# Altium footprint library IC.PcbLib: 220 footprints (part 11 of 14)
Each footprint in its own frame and in the unit in brackets; x right, y up, seen from the top. Pads: shape width x height; smd on the part's side, far side on the other; paste and mask are expansions set on the pad; w line width, h text height; cw(c..) or ccw(c..) is an arc to the next point about the centre after c.
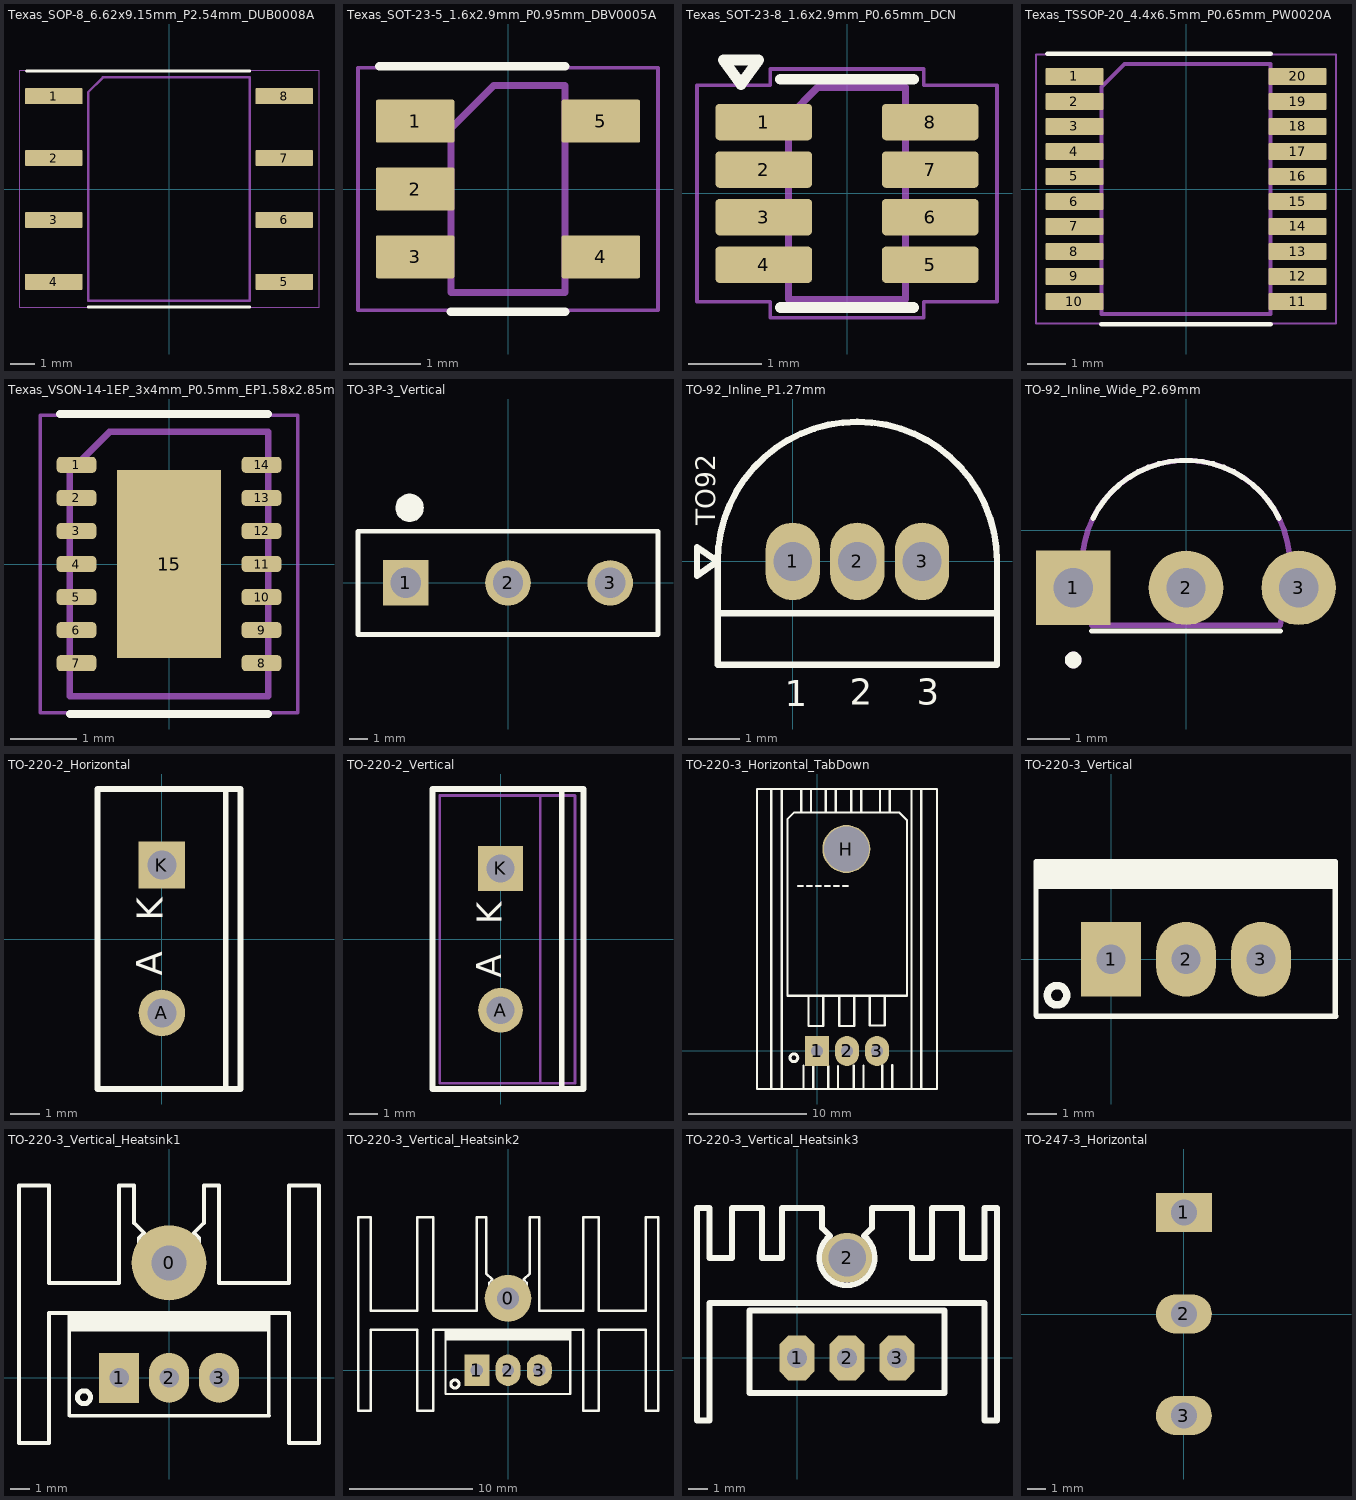
[diagram p10: the footprints below, top view; thin cyan lines are the x and y axes]

## Texas_SOP-8_6.62x9.15mm_P2.54mm_DUB0008A [mm] "ISO1050DUBR, 1 Mbps isolated CAN transceiver, 2.5 kVrms — Thu phát CAN cách ly 2,5 kVrms, 1 Mbps [Thu phat CAN cach ly 2,5 kVrms, 1 Mbps]"
height 4.85
pads (8):
  rrect8% 2.35x0.65 smd: 1(-4.725,3.81) 2(-4.725,1.27) 3(-4.725,-1.27) 4(-4.725,-3.81) 5(4.725,-3.81) 6(4.725,-1.27) 7(4.725,1.27) 8(4.725,3.81)
Top Overlay:
  lines w0.12: -5.85,4.845 3.31,4.845 ; -3.31,-4.845 3.31,-4.845
  text ".Designator" at -3.31,5.05 h1
Mechanical 2:
  lines w0.1: -3.31,-4.575 3.31,-4.575 3.31,4.575 -2.71,4.575 -3.31,3.975 -3.31,-4.575
Mechanical 4:
  lines w0.05: -6.15,-4.85 6.15,-4.85 6.15,4.85 -6.15,4.85 -6.15,-4.85
3D body "Texas_SOP-8_6.62x9.15mm_P2.54mm_DUB0008A.step": height 0, standoff 0, extent -5.9,-4.135 5.9,4.135

## Texas_SOT-23-5_1.6x2.9mm_P0.95mm_DBV0005A [mm] "TLV75533PDBVR, 3.3 V, 500 mA LDO regulator with output discharge — Ổn áp LDO 3,3 V, 500 mA, có xả ngõ ra [On ap LDO 3,3 V, 500 mA, co xa ngo ra]"
height 1.45
pads (5):
  rrect8% 1.1x0.6 smd: 1(-1.3,0.95) 2(-1.3,0) 3(-1.3,-0.95) 4(1.3,-0.95) 5(1.3,0.95)
Top Overlay:
  lines w0.12: -1.8,1.72 0.8,1.72 ; -0.8,-1.72 0.8,-1.72
  text ".Designator" at -0.8,1.9 h1
Mechanical 2:
  lines w0.1: -0.8,-1.45 0.8,-1.45 0.8,1.45 -0.2,1.45 -0.8,0.85 -0.8,-1.45
Mechanical 4:
  lines w0.05: -2.1,-1.7 2.1,-1.7 2.1,1.7 -2.1,1.7 -2.1,-1.7
3D body "Texas_SOT-23-5_1.6x2.9mm_P0.95mm_DBV0005A.step": height 0, standoff 0, extent -1.85,-1.25 1.85,1.25

## Texas_SOT-23-8_1.6x2.9mm_P0.65mm_DCN [mm] "INA219AIDCNR, I2C current, voltage and power monitor — IC đo dòng, điện áp và công suất qua I2C [IC do dong, dien ap va cong suat qua I2C]"
height 1.2
pads (8):
  rrect25% 1.325x0.5 smd: 1(-1.138,0.975) 2(-1.138,0.325) 3(-1.138,-0.325) 4(-1.138,-0.975) 5(1.138,-0.975) 6(1.138,-0.325) 7(1.138,0.325) 8(1.138,0.975)
Top Overlay:
  lines w0.15: -0.91,-1.56 0.91,-1.56 ; -0.91,1.56 0.91,1.56 ; -1.69,1.82 -1.45,1.49 -1.21,1.82 -1.69,1.82
Mechanical 2:
  lines w0.1: -0.8,-1.45 0.8,-1.45 0.8,1.45 -0.4,1.45 -0.8,1.05 -0.8,-1.45
Mechanical 4:
  lines w0.05: -2.05,-1.48 -2.05,1.48 -1.05,1.48 -1.05,1.7 1.05,1.7 1.05,1.48 2.05,1.48 2.05,-1.48 1.05,-1.48 1.05,-1.7 -1.05,-1.7 -1.05,-1.48 -2.05,-1.48
3D body "Texas_SOT-23-8_1.6x2.9mm_P0.65mm_DCN.step": height 0, standoff 0, extent -1.8,-1.225 1.8,1.225

## Texas_TSSOP-20_4.4x6.5mm_P0.65mm_PW0020A [mm] "BQ7692003PWR, 3–5 cell Li-ion/LiFePO4 battery AFE, I2C with CRC — IC đo và bảo vệ pin Li-ion/LiFePO4 3–5 cell, I2C có CRC [IC do va bao ve pin Li-ion/LiFePO4 3–5 cell, I2C co CRC]"
height 1.2
pads (20):
  rrect11% 1.5x0.45 smd: 1(-2.9,2.925) 2(-2.9,2.275) 3(-2.9,1.625) 4(-2.9,0.975) 5(-2.9,0.325) 6(-2.9,-0.325) 7(-2.9,-0.975) 8(-2.9,-1.625) 9(-2.9,-2.275) 10(-2.9,-2.925) 11(2.9,-2.925) 12(2.9,-2.275) 13(2.9,-1.625) 14(2.9,-0.975) 15(2.9,-0.325) 16(2.9,0.325) 17(2.9,0.975) 18(2.9,1.625) 19(2.9,2.275) 20(2.9,2.925)
Top Overlay:
  lines w0.12: -3.6,3.52 2.2,3.52 ; -2.2,-3.52 2.2,-3.52
  text ".Designator" at -2.2,3.7 h1
Mechanical 2:
  lines w0.1: -2.2,-3.25 2.2,-3.25 2.2,3.25 -1.6,3.25 -2.2,2.65 -2.2,-3.25
Mechanical 4:
  lines w0.05: -3.9,-3.5 3.9,-3.5 3.9,3.5 -3.9,3.5 -3.9,-3.5
3D body "Texas_TSSOP-20_4.4x6.5mm_P0.65mm_PW0020A.step": height 0, standoff 0, extent -3.65,-3.15 3.65,3.15

## Texas_VSON-14-1EP_3x4mm_P0.5mm_EP1.58x2.85mm_DSJ [mm] "TPS63020DSJR, Adjustable synchronous buck-boost converter, 1.8–5.5 V input — Nguồn xung tăng giảm áp đồng bộ chỉnh được, đầu vào 1,8–5,5 V [Nguon xung tang giam ap dong bo chinh duoc, dau vao 1,8–5,5 V]"
height 1
pads (15):
  rrect50% 0.6x0.24 smd mask+0.07: 1(-1.4,1.5) 2(-1.4,1) 3(-1.4,0.5) 4(-1.4,0) 5(-1.4,-0.5) 6(-1.4,-1) 7(-1.4,-1.5) 8(1.4,-1.5) 9(1.4,-1) 10(1.4,-0.5) 11(1.4,0) 12(1.4,0.5) 13(1.4,1) 14(1.4,1.5)
  rect 1.58x2.85 smd paste-2.85 mask+0.03: 15(0,0)
Top Overlay:
  lines w0.12: -1.65,2.27 1.5,2.27 ; -1.5,-2.27 1.5,-2.27
  text ".Designator" at -1.5,2.45 h1
Top Paste:
  region: -0.68,-1.225 -0.667,-1.275 -0.63,-1.312 -0.58,-1.325 0.58,-1.325 0.63,-1.312 0.667,-1.275 0.68,-1.225 0.68,-0.225 0.667,-0.175 0.63,-0.138 0.58,-0.125 -0.58,-0.125 -0.63,-0.138 -0.667,-0.175 -0.68,-0.225
  region: -0.68,0.225 -0.667,0.175 -0.63,0.138 -0.58,0.125 0.58,0.125 0.63,0.138 0.667,0.175 0.68,0.225 0.68,1.225 0.667,1.275 0.63,1.312 0.58,1.325 -0.58,1.325 -0.63,1.312 -0.667,1.275 -0.68,1.225
Mechanical 2:
  lines w0.1: -1.5,-2 1.5,-2 1.5,2 -0.9,2 -1.5,1.4 -1.5,-2
Mechanical 4:
  lines w0.05: -1.95,-2.25 1.95,-2.25 1.95,2.25 -1.95,2.25 -1.95,-2.25
3D body "Texas_VSON-14-1EP_3x4mm_P0.5mm_EP1.58x2.85mm_DSJ.step": height 0, standoff 0, extent -1.7,-1.62 1.7,1.62

## TO-3P-3_Vertical [mm] "TO-3P / TO-3PN 3-pin + mounting hole vertical, pitch 5.45mm"
height 23.8
pads (4):
  rect 2.43x2.43 hole 1.62: 1(-5.45,0)
  round 2.43 hole 1.62: 2(0,0) 3(5.45,0)
  round 1.524 on Top Overlay: ""(-5.25,4)
Top Overlay:
  lines w0.254: -8,-2.75 8,-2.75 8,2.75 -8,2.75 -8,-2.75
3D body "FGA60N65SMD.stp": height 23.4, standoff -37.4, extent -7.8,-2.5 7.8,2.5

## TO-92_Inline_P1.27mm [mil] "TO-92 inline, 3 pins, pitch 1.27mm"
height 342.52
pads (3):
  oval 42x60 hole 30 mask+3: 1(0,0) 2(50,0) 3(100,0)
Top Overlay:
  lines w5: -58,-40 158,-40 ; -58,0 cw(c50,0) 158,0 158,-80 -58,-80 -58,0 ; -58,0 -74,-11 -74,11 -58,0
  text "1" at -6,-112 h20
  text "2" at 44,-111 h20
  text "3" at 96,-111 h20
  text "TO92" at -60,28 h15
3D body "TO-92-2.STEP": height 418.5, standoff -140.55, extent -44.37,-63.73 144.39,93.75

## TO-92_Inline_Wide_P2.69mm [mm] "TO-92 wide inline, 3 pins, pitch 2.69mm (DS18B20)"
pads (3):
  rect 1.778x1.778 hole 0.94: 1(-2.69,-1.37)
  round 1.778 hole 0.94: 2(0,-1.37) 3(2.69,-1.37)
Top Overlay:
  circle w0.2: c-2.69,-3.093 r0.1
  lines w0.127: -2.246,-2.4 2.246,-2.4 ; -2.219,0.285 cw(c0,-0.797) 2.219,0.285
Mechanical 13:
  circle w0.2: c-2.69,-3.093 r0.1
  lines w0.127: -2.475,-0.803 cw(c0,-0.803) 2.475,-0.803 2.246,-2.268 -2.246,-2.268 -2.475,-0.803
3D body "ALSRobot-TO-92W.STEP": height 7.24, standoff -4.06, extent -2.765,-3.084 2.765,1.016

## TO-220-2_Horizontal [mm] "TO-220AC 2-pin bent/horizontal, pitch 5.08mm"
pads (2):
  round 1.6 hole 1: A(0,-2.54)
  rect 1.6x1.6 hole 1: K(0,2.54)
Top Overlay:
  lines w0.2: 2.195,-5.15 2.195,5.15 ; -2.205,-5.15 2.695,-5.15 2.695,5.15 -2.205,5.15 -2.205,-5.15
  text "K" at 0.33,0.635 h1.52
  text "A" at 0.305,-1.27 h1.52
3D body "User Library-TO220 L.step": height 7.2, standoff -0.3, extent -0.052,-4.9 19.652,5.1

## TO-220-2_Vertical [mm] "TO-220AC 2-pin vertical, pitch 5.08mm"
height 19.05
pads (2):
  round 1.6 hole 1: A(0,-2.54)
  rect 1.6x1.6 hole 1: K(0,2.54)
Top Overlay:
  lines w0.2: 2.184,-5.258 2.195,5.334 ; -2.438,-5.359 2.972,-5.359 2.972,5.385 -2.438,5.385 -2.438,-5.359
  text "A" at 0.33,-1.372 h1.52
  text "K" at 0.356,0.533 h1.52
Mechanical 8:
  lines w0.1: 1.42,-5.15 1.42,5.15 ; -2.18,-5.15 2.67,-5.15 2.67,5.15 -2.18,5.15 -2.18,-5.15
3D body: height 14.33, standoff 12.8, extent 1.42,-4.975 2.67,4.975
3D body: height 19.05, standoff 18.18, extent 1.42,-4.975 2.67,4.975
3D body: height 14.37, standoff 14.33, extent 1.42,-4.975 2.67,-0.376
3D body: height 18.18, standoff 18.14, extent 1.42,-4.975 2.67,-0.376
3D body: height 14.48, standoff 14.36, extent 1.42,-4.975 2.67,-0.737
3D body: height 18.14, standoff 18.03, extent 1.42,-4.975 2.67,-0.737
3D body: height 2.79, standoff 0, extent -0.25,1.875 0.25,3.205
3D body: height 14.37, standoff 14.33, extent 1.42,0.376 2.67,4.975
3D body: height 18.18, standoff 18.14, extent 1.42,0.376 2.67,4.975
3D body: height 14.48, standoff 14.36, extent 1.42,0.737 2.67,4.975
3D body: height 18.14, standoff 18.03, extent 1.42,0.737 2.67,4.975
3D body: height 14.65, standoff 14.47, extent 1.42,1.069 2.67,4.975
3D body: height 18.03, standoff 17.85, extent 1.42,1.069 2.67,4.975
3D body: height 14.89, standoff 14.65, extent 1.42,1.361 2.67,4.975
3D body: height 17.86, standoff 17.61, extent 1.42,1.361 2.67,4.975
3D body: height 15.19, standoff 14.89, extent 1.42,1.601 2.67,4.975
3D body: height 17.62, standoff 17.32, extent 1.42,1.601 2.67,4.975
3D body: height 15.52, standoff 15.18, extent 1.42,1.778 2.67,4.975
3D body: height 17.32, standoff 16.99, extent 1.42,1.778 2.67,4.975
3D body: height 15.88, standoff 15.51, extent 1.42,1.888 2.67,4.975
3D body: height 16.99, standoff 16.63, extent 1.42,1.888 2.67,4.975
3D body: height 16.25, standoff 15.87, extent 1.42,1.925 2.67,4.975
3D body: height 16.63, standoff 16.25, extent 1.42,1.925 2.67,4.975
3D body: height 2.79, standoff 0, extent -0.25,-3.205 0.25,-1.875
3D body: height 14.65, standoff 14.47, extent 1.42,-4.975 2.67,-1.069
3D body: height 18.03, standoff 17.85, extent 1.42,-4.975 2.67,-1.069
3D body: height 14.89, standoff 14.65, extent 1.42,-4.975 2.67,-1.361
3D body: height 17.86, standoff 17.61, extent 1.42,-4.975 2.67,-1.361
3D body: height 15.19, standoff 14.89, extent 1.42,-4.975 2.67,-1.601
3D body: height 17.62, standoff 17.32, extent 1.42,-4.975 2.67,-1.601
3D body: height 15.52, standoff 15.18, extent 1.42,-4.975 2.67,-1.778
3D body: height 17.32, standoff 16.99, extent 1.42,-4.975 2.67,-1.778
3D body: height 15.88, standoff 15.51, extent 1.42,-4.975 2.67,-1.888
3D body: height 16.99, standoff 16.63, extent 1.42,-4.975 2.67,-1.888
3D body: height 16.25, standoff 15.87, extent 1.42,-4.975 2.67,-1.925
3D body: height 16.63, standoff 16.25, extent 1.42,-4.975 2.67,-1.925
3D body: height 0, standoff -1.6, extent -0.25,2.155 0.25,2.925
3D body: height 0, standoff -1.6, extent -0.25,-2.925 0.25,-2.155
3D body: height 12.8, standoff 2.79, extent -2.18,-5.15 2.67,5.15

## TO-220-3_Horizontal_TabDown [mil] "TO-220 3-pin horizontal with mounting hole, pitch 2.54mm"
height 200
pads (4):
  rect 80x100 hole 39: 1(0,0)
  oval 80x100 hole 39: 2(100,0) 3(200,0)
  round 160 hole 150: H(98,673)
Top Overlay:
  circle w10: c-77.03,-23 r12.97
  lines w7: -99,549 -99,772 -77,794 275,794 300,769 300,730 ; -99,552 -99,184 300,184 300,553 ; -29,178 -29,83 21,83 21,180 20,181 ; 74,178 74,83 124,83 124,180 123,181 ; 176,180 176,85 226,85 226,182 225,183 ; 300,552 300,733
  lines w8: -152,-127 -152,873 ; -117,-127 -117,873 ; -53,796 -53.01,869.97 ; -45,-124 -45.01,-50.03 ; -20,796 -20.01,869.97 ; -12,-124 -12.01,-50.03 ; 29,795 28.99,868.97 ; 37,-125 36.99,-51.03 ; 62,795 61.99,868.97 ; 70,-125 69.99,-51.03 ; 114,796 113.99,869.97 ; 122,-124 121.99,-50.03 ; 147,796 146.99,869.97 ; 155,-124 154.99,-50.03 ; 210,798 209.99,871.97 ; 218,-122 217.99,-48.03 ; 243,798 242.99,871.97 ; 251,-122 250.99,-48.03 ; 315,-127 315,873 ; 348,-127 348,873 ; -200,-127 -200,873 400,873 400,-127 -200,-127
  text "------" at -69,527 h60
3D body "SW3DPS-TO-220-DEFAULT.STEP": height 165.35, standoff -118.11, extent -100,-3.66 300,763.66

## TO-220-3_Vertical [mil] "TO-220 3-pin vertical, pitch 2.54mm"
height 200
pads (3):
  rect 80x100 hole 39: 1(0,0)
  oval 80x100 hole 39: 2(100,0) 3(200,0)
Top Overlay:
  circle w10: c-72.03,-48 r12.97
  rectangle: -99,94 300,130
  lines w7: 298,107 299,93 ; -100,-75 -99,-76 -76,-76 300,-76 299,-75 299,130 -100,130 -100,-75
3D body "User Library-TO-220-1.STEP": height 322.83, standoff -810.24, extent -94.88,-80 294.88,97.17

## TO-220-3_Vertical_Heatsink1 [mil] "TO-220 3-pin vertical with heatsink 34M8491, pitch 2.54mm"
height 200
pads (4):
  round 150 hole 70: 0(0,230)
  rect 80x100 hole 39: 1(-100,0)
  oval 80x100 hole 39: 2(0,0) 3(100,0)
Top Overlay:
  circle w10: c-170.03,-39 r12.97
  rectangle: -201,93 198,129
  lines w7: -200,100 198.5,100 199,93 ; -200,-75 -199,-76 -176,-76 200,-76 199,-75 199,130 -200,130 -200,-75
  lines w8: -300,-130 -300,385 -240,385 -240,190 -100,190 -100,385 -70,385 -70,310 -50,290 -60,280 -60,210 -40,190 40,190 60,210 60,280 50,290 70,310 70,385 100,385 100,190 240,190 240,385 300,385 300,-130 240,-130 240,130 -240,130 -240,-130 -300,-130
3D body "User Library-Disipador 34M8491-1.STEP": height 1000, standoff -122.05, extent -246,73.03 250.06,328.97
3D body "User Library-TO-220-1.STEP": height 850.24, standoff -282.83, extent -194.88,-82 194.88,95.17

## TO-220-3_Vertical_Heatsink2 [mil] "TO-220 3-pin vertical with large heatsink, pitch 2.54mm"
height 200
pads (4):
  round 150 hole 70: 0(0,230)
  rect 80x100 hole 39: 1(-100,0)
  oval 80x100 hole 39: 2(0,0) 3(100,0)
Top Overlay:
  circle w10: c-169.97,-44 r12.97
  rectangle: -201,95 198,131
  lines w7: -200,100 198.5,100 199,93 ; -200,-75 -199,-76 -176,-76 200,-76 199,-75 199,130 -200,130 -200,-75
  lines w8: -480,-130 -480,490 -440,490 -440,190 -290,190 -290,490 -240,490 -240,190 -100,190 -100,490 -70,490 -70,310 -50,290 -60,280 -60,210 -40,190 40,190 60,210 60,280 50,290 70,310 70,490 100,490 100,190 240,190 240,490 290,490 290,190 440,190 440,490 480,490 480,-130 440,-130 440,130 290,130 290,-130 240,-130 240,130 -240,130 -240,-130 -290,-130 -290,130 -440,130 -440,-130 -480,-130
3D body "User Library-TO-220-1.STEP": height 810.24, standoff -322.83, extent -194.76,-82.17 195,95
3D body "User Library-heat sink-1.STEP": height 1205.51, standoff 0, extent -448.79,-177 452.79,468.67

## TO-220-3_Vertical_Heatsink3 [mil] "TO-220 3-pin vertical with TO-126 heatsink, pitch 2.54mm"
pads (4):
  oct 70x90 hole 40: 1(0,0) 2(100,0) 3(200,0)
  round 100 hole 75: 2(100,200)
Top Overlay:
  lines w12: 66,244 50,260 50,300 -30,300 -30,200 -70,200 -70,300 -130,300 -130,200 -175,200 -175,300 -200,300 -200,-125 -175,-125 -175,110 375,110 375,-125 400,-125 400,300 375,300 375,200 330,200 330,300 270,300 270,200 230,200 230,300 150,300 150,260 133.59,243.59 ; 66.37,243.52 ccw(c100,200) 133.77,243.41 ; -95,-70 -95,95 295,95 295,-70 -95,-70
3D body "SW3dPS-heatsink TO126.STEP": height 984.25, standoff -149.61, extent -189.97,-102.25 391.97,323
3D body "User Library-TO-220-1.STEP": height 322.83, standoff -810.24, extent -96.88,-76.17 292.88,101

## TO-247-3_Horizontal [mm] "TO-247 3-pin bent/horizontal, pitch 5.45mm"
height 12
pads (3):
  rect 3x2.1 hole 1.4: 1(0,5.45)
  oval 3x2.1 hole 1.4: 2(0,0) 3(0,-5.45)
Bottom Overlay:
  lines w0.2: 2.21,-8.05 2.21,8.05 ; -2.49,-8.05 -2.49,8.05 2.71,8.05 2.71,-8.05 -2.49,-8.05
  text "E" at -5.5,-8 h2.2
  text "G" at -5.5,5 h2.2
  text "C" at -5.5,-0.5 h2.2
3D body "TO-247-3_Horizontal.step": height 5, standoff -3, extent -0.504,-7.95 22.75,7.95